# Altium integrated library 51Min-system_BYKX.IntLib: 16 symbols
Pins are listed as number, name and electrical type; pins without a type are passive.

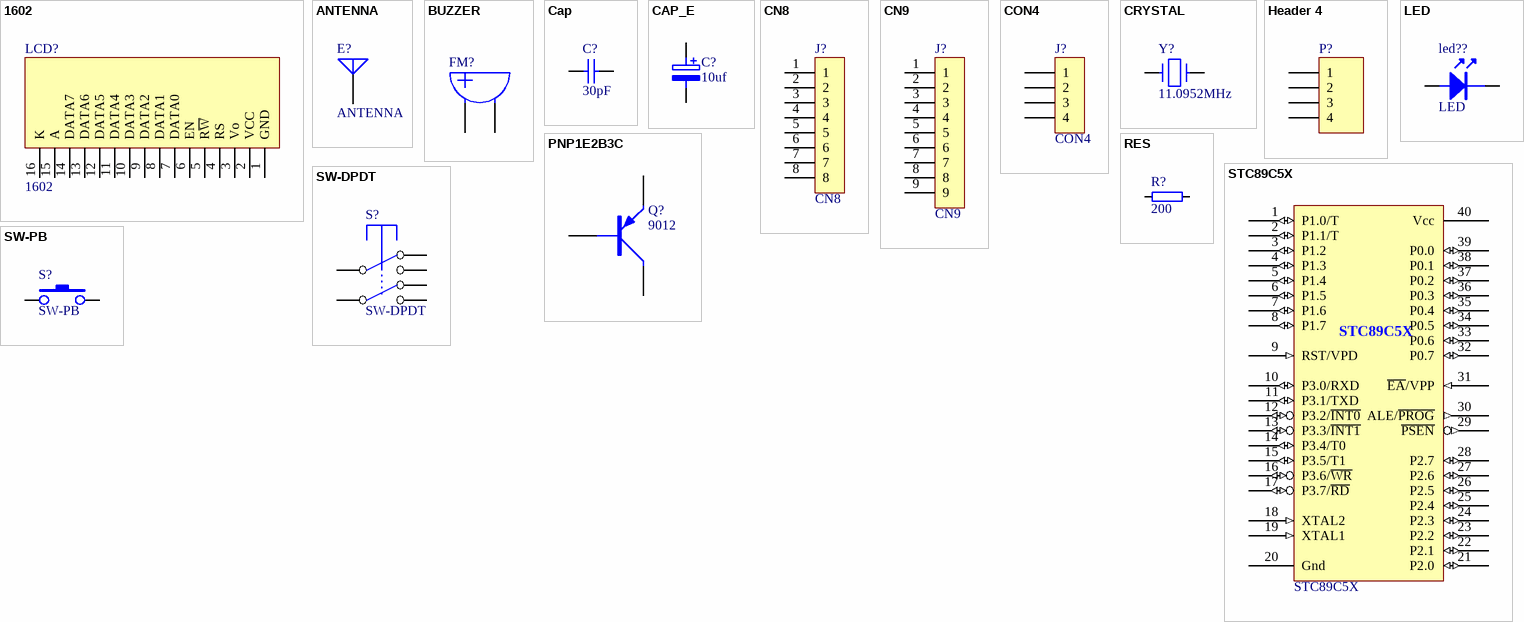
[diagram p0: symbols 1602 to SW-PB]

## 1602
designator LCD?
footprint 1602
footprint 1602-1
pins: 1 GND, 2 VCC, 3 Vo, 4 RS, 5 R~{W}, 6 EN, 7 DATA0, 8 DATA1, 9 DATA2, 10 DATA3, 11 DATA4, 12 DATA5, 13 DATA6, 14 DATA7, 15 A, 16 K

## ANTENNA
designator E?
Generic Antenna
footprint HDR1X1
pins: 1 A

## BUZZER
designator FM?
Buzzer
footprint BELL
pins: 1 A, 2 B

## Cap
designator C?  value 30pF  (hidden comment: Cap)
Capacitor; Published: 8-Jun-2000; LatestRevisionDate: 17-Jul-2002; LatestRevisionNote: Re-released for DXP Platform.; Publisher: Altium Limited
footprint RAD-0.3 (Capacitor; 2 Leads)
footprint CAPR2.54-5.1x3.2 (Capacitor, Ceramic, Thru-Hole, Dipped Radial; Body 5.1 x 3.2 mm (WxT) Pin Spacing 2.54 mm (typ))
footprint CAPR5.08-7.8x3.2 (Capacitor, Ceramic, Thru-Hole, Dipped Radial; Body 7.8 x 3.2 mm (WxT) Pin Spacing 5.08 mm (typ))
simulation model CAP (Capacitor)
signal-integrity model Cap
footprint 0805
pins: 1, 2

## CAP_E
designator C?, comment 10uf
Electrolytic Capacitor
footprint RB.2/.4
footprint RB.1/.2
footprint RB.3/.6
footprint 3528
footprint rbc.3
footprint rbc.2
footprint 7243
footprint 3216
footprint RB.08/.12
footprint RB.1/.3
footprint RB.2/.5
footprint RB.4/.8
footprint RB.5/1.0
pins: 1, 2

## CN8
designator J?
footprint CN8
pins: 1, 2, 3, 4, 5, 6, 7, 8

## CN9
designator J?
footprint CN9
pins: 1, 2, 3, 4, 5, 6, 7, 8, 9

## CON4
designator J?
Connector
footprint SIP4
pins: 1, 2, 3, 4

## CRYSTAL
designator Y?, comment 11.0952MHz
Crystal
footprint HC-49S
footprint K-3X8
footprint SEMI_Y
pins: 1, 2

## Header 4
designator P?  (value not drawn)
Header, 4-Pin; LatestRevisionDate: 17-Jul-2002; LatestRevisionNote: Re-released for DXP Platform.; Publisher: Altium Limited
footprint HDR1X4 (Connector; Header; 4 Position)
signal-integrity model Connector
pins: 1, 2, 3, 4

## LED
designator led??
footprint LED3MM
footprint LED5MM
footprint 1005
footprint 0805
pins: 1 A, 2 K

## PNP1E2B3C
designator Q?, comment 9012
?
footprint TO92
footprint TO92B
pins: 1 E, 2 B, 3 C

## RES
designator R?, comment 200
footprint AXIAL0.4
footprint AXIAL0.5
footprint AXIAL0.3
footprint 0805
pins: 1, 2

## STC89C5X
designator U?
footprint LOCK40PIN (green lock IC)
footprint DIP-40
pins: 1 P1.0/T (io), 2 P1.1/T (io), 3 P1.2 (io), 4 P1.3 (io), 5 P1.4 (io), 6 P1.5 (io), 7 P1.6 (io), 8 P1.7 (io), 9 RST/VPD (in), 10 P3.0/RXD (io), 11 P3.1/TXD (io), 12 P3.2/~{INT0} (io), 13 P3.3/~{INT1} (io), 14 P3.4/T0 (io), 15 P3.5/T1 (io), 16 P3.6/~{WR} (io), 17 P3.7/~{RD} (io), 18 XTAL2 (in), 19 XTAL1 (in), 20 Gnd (power), 21 P2.0 (io), 22 P2.1 (io), 23 P2.2 (io), 24 P2.3 (io), 25 P2.4 (io), 26 P2.5 (io), 27 P2.6 (io), 28 P2.7 (io), 29 ~{PSEN} (out), 30 ALE/~{PROG} (out), 31 ~{EA}/VPP (in), 32 P0.7 (io), 33 P0.6 (io), 34 P0.5 (io), 35 P0.4 (io), 36 P0.3 (io), 37 P0.2 (io), 38 P0.1 (io), 39 P0.0 (io), 40 Vcc (power)

## SW-DPDT
designator S?
footprint SWH7*7
footprint SWH8*8
pins: 1, 2, 3, 4, 5, 6

## SW-PB
designator S?
footprint SW6*6
footprint SWL7*7
footprint SWT6*3
footprint SW_SMD_P2
footprint SW_SMD_P4
pins: 1, 2